# Altium footprint library PcbLib.PcbLib: 112 footprints (part 1 of 7)
Each footprint in its own frame and in the unit in brackets; x right, y up, seen from the top. Pads: shape width x height; smd on the part's side, far side on the other; paste and mask are expansions set on the pad; w line width, h text height; cw(c..) or ccw(c..) is an arc to the next point about the centre after c.
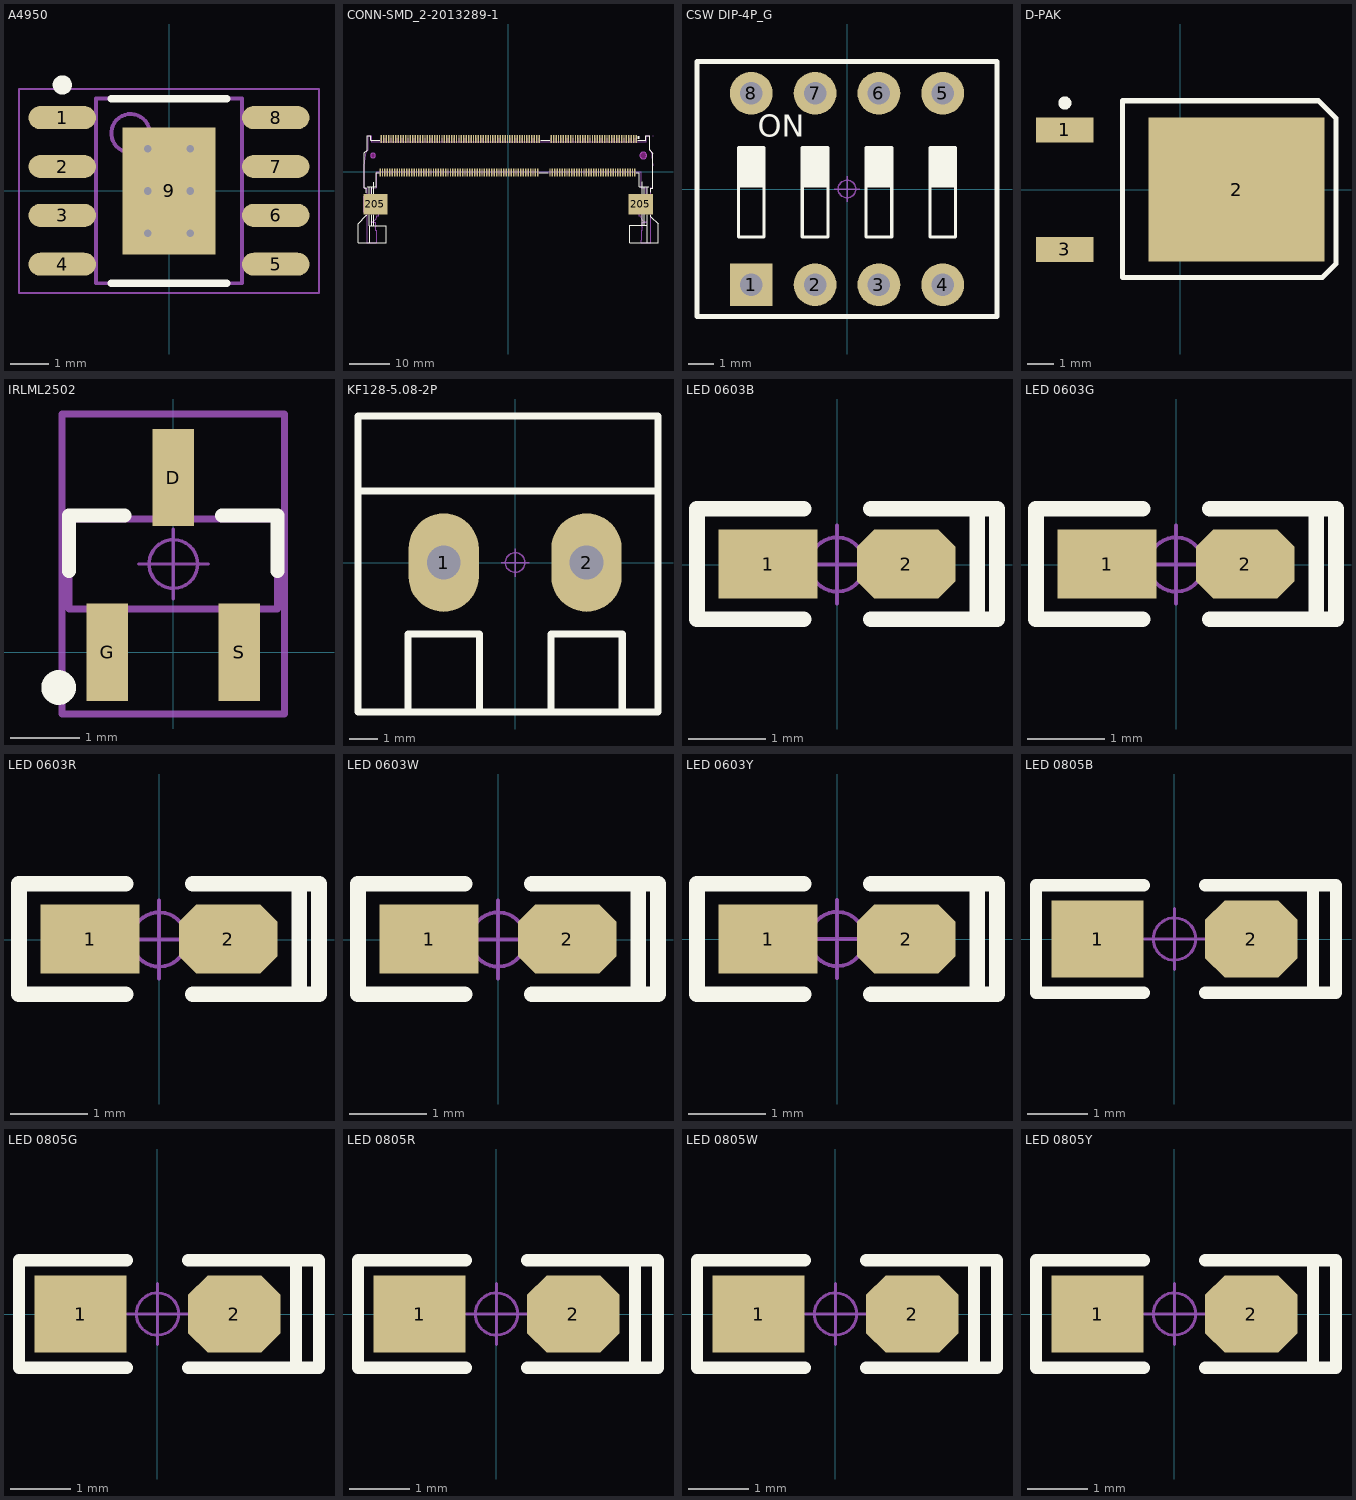
[diagram p0: the footprints below, top view; thin cyan lines are the x and y axes]

## A4950 [mm] "Package LJ, 8-Pin SOICN  with exposed thermal pad"
height 1.7
pads (9):
  oval 1.75x0.6 smd: 1(-2.775,1.905) 2(-2.775,0.635) 3(-2.775,-0.635) 4(-2.775,-1.905) 5(2.775,-1.905) 6(2.775,-0.635) 7(2.775,0.635) 8(2.775,1.905)
  rect 2.41x3.3 smd: 9(0,0)
via 0.55,-1.1 diameter 0.5 hole 0.2
via -0.55,-1.1 diameter 0.5 hole 0.2
via 0.55,0 diameter 0.5 hole 0.2
via -0.55,0 diameter 0.5 hole 0.2
via 0.55,1.1 diameter 0.5 hole 0.2
via -0.55,1.1 diameter 0.5 hole 0.2
Top Overlay:
  circle w0.25: c-2.775,2.755 r0.125
  lines w0.2: -1.5,-2.4 1.5,-2.4 ; -1.5,2.4 1.5,2.4
Mechanical 13:
  circle w0.1: c-1,1.5 r0.5
  lines w0.1: -1.9,-2.4 1.9,-2.4 1.9,2.4 -1.9,2.4 -1.9,-2.4
Mechanical 15:
  lines w0.05: -3.9,-2.65 3.9,-2.65 3.9,2.65 -3.9,2.65 -3.9,-2.65
  lines w0.1: -0.5,0 0.5,0 ; 0,-0.5 0,0.5
3D body "A4950.step": height 1.7, standoff 0, extent -3,-2.4 3,2.4

## CONN-SMD_2-2013289-1 [mil]
pads (206):
  rect 13.8x78.7 smd mask+2: 1(1246.1,316.9) 2(1234.3,-5.9) 3(1222.4,316.9) 4(1210.6,-5.9) 5(1198.8,316.9) 6(1187,-5.9) 7(1175.2,316.9) 8(1163.4,-5.9) 9(1151.6,316.9) 10(1139.8,-5.9) 11(1128,316.9) 12(1116.1,-5.9) 13(1104.3,316.9) 14(1092.5,-5.9) 15(1080.7,316.9) 16(1068.9,-5.9) 17(1057.1,316.9) 18(1045.3,-5.9) 19(1033.5,316.9) 20(1021.7,-5.9) 21(1009.8,316.9) 22(998,-5.9) 23(986.2,316.9) 24(974.4,-5.9) 25(962.6,316.9) 26(950.8,-5.9) 27(939,316.9) 28(927.2,-5.9) 29(915.4,316.9) 30(903.5,-5.9) 31(891.7,316.9) 32(879.9,-5.9) 33(868.1,316.9) 34(856.3,-5.9) 35(844.5,316.9) 36(832.7,-5.9) 37(820.9,316.9) 38(809.1,-5.9) 39(797.2,316.9) 40(785.4,-5.9) 41(773.6,316.9) 42(761.8,-5.9) 43(750,316.9) 44(738.2,-5.9) 45(726.4,316.9) 46(714.6,-5.9) 47(702.8,316.9) 48(690.9,-5.9) 49(679.1,316.9) 50(667.3,-5.9) 51(655.5,316.9) 52(643.7,-5.9) 53(631.9,316.9) 54(620.1,-5.9) 55(608.3,316.9) 56(596.5,-5.9) 57(584.6,316.9) 58(572.8,-5.9) 59(561,316.9) 60(549.2,-5.9) 61(537.4,316.9) 62(525.6,-5.9) 63(513.8,316.9) 64(502,-5.9) 65(490.2,316.9) 66(478.3,-5.9) 67(466.5,316.9) 68(454.7,-5.9) 69(442.9,316.9) 70(431.1,-5.9) 71(419.3,316.9) 72(407.5,-5.9) 73(301.2,316.9) 74(289.4,-5.9) 75(277.6,316.9) 76(265.7,-5.9) 77(253.9,316.9) 78(242.1,-5.9) 79(230.3,316.9) 80(218.5,-5.9) 81(206.7,316.9) 82(194.9,-5.9) 83(183.1,316.9) 84(171.3,-5.9) 85(159.4,316.9) 86(147.6,-5.9) 87(135.8,316.9) 88(124,-5.9) 89(112.2,316.9) 90(100.4,-5.9) 91(88.6,316.9) 92(76.8,-5.9) 93(65,316.9) 94(53.1,-5.9) 95(41.3,316.9) 96(29.5,-5.9) 97(17.7,316.9) 98(5.9,-5.9) 99(-5.9,316.9) 100(-17.7,-5.9) 101(-29.5,316.9) 102(-41.3,-5.9) 103(-53.2,316.9) 104(-65,-5.9) 105(-76.8,316.9) 106(-88.6,-5.9) 107(-100.4,316.9) 108(-112.2,-5.9) 109(-124,316.9) 110(-135.8,-5.9) 111(-147.6,316.9) 112(-159.4,-5.9) 113(-171.3,316.9) 114(-183.1,-5.9) 115(-194.9,316.9) 116(-206.7,-5.9) 117(-218.5,316.9) 118(-230.3,-5.9) 119(-242.1,316.9) 120(-253.9,-5.9) 121(-265.7,316.9) 122(-277.6,-5.9) 123(-289.4,316.9) 124(-301.2,-5.9) 125(-313,316.9) 126(-324.8,-5.9) 127(-336.6,316.9) 128(-348.4,-5.9) 129(-360.2,316.9) 130(-372,-5.9) 131(-383.9,316.9) 132(-395.7,-5.9) 133(-407.5,316.9) 134(-419.3,-5.9) 135(-431.1,316.9) 136(-442.9,-5.9) 137(-454.7,316.9) 138(-466.5,-5.9) 139(-478.3,316.9) 140(-490.2,-5.9) 141(-502,316.9) 142(-513.8,-5.9) 143(-525.6,316.9) 144(-537.4,-5.9) 145(-549.2,316.9) 146(-561,-5.9) 147(-572.8,316.9) 148(-584.6,-5.9) 149(-596.5,316.9) 150(-608.3,-5.9) 151(-620.1,316.9) 152(-631.9,-5.9) 153(-643.7,316.9) 154(-655.5,-5.9) 155(-667.3,316.9) 156(-679.1,-5.9) 157(-690.9,316.9) 158(-702.8,-5.9) 159(-714.6,316.9) 160(-726.4,-5.9) 161(-738.2,316.9) 162(-750,-5.9) 163(-761.8,316.9) 164(-773.6,-5.9) 165(-785.4,316.9) 166(-797.2,-5.9) 167(-809.1,316.9) 168(-820.9,-5.9) 169(-832.7,316.9) 170(-844.5,-5.9) 171(-856.3,316.9) 172(-868.1,-5.9) 173(-879.9,316.9) 174(-891.7,-5.9) 175(-903.5,316.9) 176(-915.4,-5.9) 177(-927.2,316.9) 178(-939,-5.9) 179(-950.8,316.9) 180(-962.6,-5.9) 181(-974.4,316.9) 182(-986.2,-5.9) 183(-998,316.9) 184(-1009.8,-5.9) 185(-1021.7,316.9) 186(-1033.5,-5.9) 187(-1045.3,316.9) 188(-1057.1,-5.9) 189(-1068.9,316.9) 190(-1080.7,-5.9) 191(-1092.5,316.9) 192(-1104.3,-5.9) 193(-1116.1,316.9) 194(-1128,-5.9) 195(-1139.8,316.9) 196(-1151.6,-5.9) 197(-1163.4,316.9) 198(-1175.2,-5.9) 199(-1187,316.9) 200(-1198.8,-5.9) 201(-1210.6,316.9) 202(-1222.4,-5.9) 203(-1234.3,316.9) 204(-1246.1,-5.9)
  rect 236.2x196.9 smd mask+2: 205(-1291.3,-316.9) 205(1291.3,-316.9)
Top Overlay:
  circle w10: c1269.7,332.7 r7.9
  lines w10: -1379.9,-206.7 -1379.9,-157.5 -1397.6,-157.5 -1397.6,183.1 -1370.1,210.6 -1370.1,350.4 -1338.6,350.4 -1338.6,305.1 -1299.2,305.1 -1250.2,305.1 ; -1377.9,-425.2 -1378.1,-425.2 -1460.8,-507.9 -1460.8,-692.9 -1187,-692.9 -1185.2,-691.1 -1185.2,-523.6 -1350.3,-523.6 ; -1370.1,-145.7 -1281.5,-145.7 -1281.5,-9.9 -1256.1,-9.9 ; -1350.3,-416.6 -1350.3,-523.6 ; -1350.3,-217.3 -1350.3,-145.7 ; -1348.7,-692.9 -1348.7,-525.2 -1350.3,-523.6 ; -1326.1,-523.6 -1326.1,-416.6 ; -1326.1,-217.3 -1326.1,-147.7 ; -1305.7,-523.6 -1305.7,-416.6 ; -1305.7,-217.3 -1305.7,-100.4 ; 305.4,-11.2 391.5,-11.2 ; 317.2,305.1 403.3,305.1 ; 1245.3,-11.2 1277.6,-11.2 1277.6,-145.7 1370.1,-145.7 ; 1261.1,305.1 1277.6,305.1 1338.6,305.1 1338.6,350.4 1370.1,350.4 1376,350.4 1376,212.6 1393.7,194.9 1409.4,179.1 1409.4,-157.5 1407.5,-159.4 1389.8,-159.4 1389.8,-198.8 ; 1303.6,-521.7 1303.6,-414.6 ; 1303.6,-215.3 1303.6,-98.4 ; 1324,-521.7 1324,-414.6 ; 1324,-215.3 1324,-145.7 ; 1352.2,-416.6 1352.2,-521.7 ; 1352.2,-217.3 1352.2,-145.7 ; 1353.3,-692.9 1353.3,-522.7 1352.2,-521.7 ; 1389.8,-423.2 1389.8,-437 1458.7,-505.9 1458.7,-690.9 1456.7,-692.9 1183.1,-692.9 1183.1,-521.7 1352.2,-521.7
Keep-Out Layer:
  board cut-out: -1291.4,157.5 -1291.4,162.19 -1294.99,170.87 -1301.63,177.51 -1310.31,181.1 -1319.69,181.1 -1328.37,177.51 -1335.01,170.87 -1338.6,162.19 -1338.6,157.5 -1338.6,152.81 -1335.01,144.13 -1328.37,137.49 -1319.69,133.9 -1310.31,133.9 -1301.63,137.49 -1294.99,144.13 -1291.4,152.81
  board cut-out: 1348.5,157.5 1348.5,161.91 1346.22,170.43 1341.81,178.07 1335.57,184.31 1327.93,188.72 1319.41,191 1310.59,191 1302.07,188.72 1294.43,184.31 1288.19,178.07 1283.78,170.43 1281.5,161.91 1281.5,157.5 1281.5,153.09 1283.78,144.57 1288.19,136.93 1294.43,130.69 1302.07,126.28 1310.59,124 1319.41,124 1327.93,126.28 1335.57,130.69 1341.81,136.93 1346.22,144.57 1348.5,153.09
Mechanical 1:
  circle w0.2: c-1315,157.5 r23.6
  circle w0.2: c1315,157.5 r33.5
Mechanical 15:
  drawing of 327 lines, arcs and shapes, not listed

## CSW DIP-4P_G [mm] "11.7*9.9*7mm"
pads (8):
  rect 1.7x1.7 hole 0.9: 1(-3.81,-3.81)
  round 1.7 hole 0.9: 2(-1.27,-3.81) 3(1.27,-3.81) 4(3.81,-3.81) 5(3.81,3.81) 6(1.27,3.81) 7(-1.27,3.81) 8(-3.81,3.81)
Top Overlay:
  rectangle: 3.302,0.127 4.318,1.651
  rectangle: 0.762,0.127 1.778,1.651
  rectangle: -1.778,0.127 -0.762,1.651
  rectangle: -4.318,0.127 -3.302,1.651
  lines w0.127: -4.318,0.127 -3.302,0.127 ; -1.778,0.127 -0.762,0.127 ; 0.762,0.127 1.778,0.127 ; 3.302,0.127 4.318,0.127 ; -4.318,-1.905 -3.302,-1.905 -3.302,1.651 -4.318,1.651 -4.318,-1.905 ; -1.778,-1.905 -0.762,-1.905 -0.762,1.651 -1.778,1.651 -1.778,-1.905 ; 0.762,-1.905 1.778,-1.905 1.778,1.651 0.762,1.651 0.762,-1.905 ; 3.302,-1.905 4.318,-1.905 4.318,1.651 3.302,1.651 3.302,-1.905
  lines w0.2: -5.969,-5.08 5.969,-5.08 5.969,5.08 -5.969,5.08 -5.969,-5.08
  text "ON" at -3.556,1.778 h1.52
Mechanical 15:
  circle w0.05: c0,0 r0.35
  lines w0.05: -0.5,0 0.5,0 ; 0,-0.5 0,0.5
3D body "CSW DIP-4P_G.STEP": height 6.65, standoff -3.15, extent -5.86,-4.95 5.86,4.95

## D-PAK [mm] "D-PAK  / SOT-428 / TO252 - 3"
height 2.38
pads (3):
  rect 2.2x0.95 smd: 1(-4.4,2.28) 3(-4.4,-2.28)
  rect 6.7x5.5 smd: 2(2.15,0)
Top Overlay:
  circle w0.25: c-4.4,3.305 r0.125
  lines w0.1: -2.2,-3.35 -2.2,3.35
  lines w0.2: -2.2,-3.35 5.418,-3.35 5.944,-2.824 5.944,2.725 5.278,3.391 -2.2,3.391 -2.2,-3.35
3D body "D-PAK.STEP": height 2.31, standoff 0, extent -4.475,-3.3 4.775,3.3

## IRLML2502 [mm] "3x1.3x1mm(�����)"
height 1.1
pads (3):
  rect 0.6x1.4 smd: D(0,2.514) G(-0.95,0) S(0.95,0)
Top Overlay:
  circle w0.25: c-1.651,-0.508 r0.125
  lines w0.2: -1.5,1.17 -1.5,1.97 -0.7,1.97 ; 0.7,1.97 1.5,1.97 1.5,1.17
Mechanical 13:
  lines w0.1: -1.5,0.62 -1.5,1.92 1.5,1.92 1.5,0.62 -1.5,0.62
Mechanical 15:
  circle w0.05: c0,1.27 r0.35
  lines w0.05: -0.5,1.27 0.5,1.27 ; 0,0.77 0,1.77
  lines w0.1: -1.6,-0.889 -1.6,3.429 1.6,3.429 1.6,-0.889 -1.6,-0.889
3D body "SOT23-3.STEP": height 1.05, standoff 0, extent -1.5,0.07 1.5,2.47

## KF128-5.08-2P [mm] "�ݶ�ʽ���߶��ӣ��ž�5.08mm"
pads (2):
  oval 2.5x3.5 hole 1.2: 1(-2.54,0) 2(2.54,0)
Top Overlay:
  lines w0.254: -5.588,2.54 5.08,2.54 ; -3.81,-5.309 -3.81,-2.54 -1.27,-2.54 -1.27,-5.309 ; 1.27,-5.309 1.27,-2.54 3.81,-2.54 3.81,-5.309 ; -5.588,-5.309 -5.588,5.207 5.08,5.207 5.08,-5.309 -5.588,-5.309
Mechanical 15:
  circle w0.05: c0,0 r0.35
  lines w0.05: -0.5,0 0.5,0 ; 0,-0.5 0,0.5
3D body "KF128-5.08.STEP": height 14.15, standoff -3.95, extent -5.58,-5.3 0,5.2
3D body "KF128-5.08.STEP": height 14.15, standoff -3.95, extent -0.5,-5.3 5.08,5.2

## LED 0603B [mil] "��ɫ0603LED                             �Ա�ID:�ƾ���ʯ"
pads (2):
  rect 50x35 smd: 1(-35,0.26)
  oct 50x35 smd: 2(35,0.26)
Top Overlay:
  lines w8: -17,-27.74 -71,-27.74 -71,-25.74 -71,28.26 -70,28.26 -17,28.26 ; 17,-27.74 70,-27.74 ; 17,28.26 71,28.26 81,28.26 81,-27.74 71,-27.74 71,26.26
Mechanical 15:
  circle w1.97: c0,0 r13.78
  lines w1.97: -19.68,0 19.68,0 ; 0,-19.68 0,19.68
3D body "LED 0603-B.STEP": height 18.36, standoff -0.16, extent -31.49,-15.79 31.5,15.79
3D body "LED 0603������.STEP": height 23.82, standoff 8.07, extent -23.58,-15.79 23.58,15.79

## LED 0603G [mil] "��ɫ0603LED                                   �Ա�ID:�ƾ���ʯ"
pads (2):
  rect 50x35 smd: 1(-35,0.26)
  oct 50x35 smd: 2(35,0.26)
Top Overlay:
  lines w8: -17,-27.74 -71,-27.74 -71,-25.74 -71,28.26 -70,28.26 -17,28.26 ; 17,-27.74 70,-27.74 ; 17,28.26 71,28.26 81,28.26 81,-27.74 71,-27.74 71,26.26
Mechanical 15:
  circle w1.97: c0,0 r13.78
  lines w1.97: -19.68,0 19.68,0 ; 0,-19.68 0,19.68
3D body "LED 0603-G.STEP": height 18.36, standoff -0.16, extent -31.49,-15.79 31.5,15.79
3D body "LED 0603������.": height 0, standoff 0, extent 0,0 0,0

## LED 0603R [mil] "��ɫ0603LED                                           �Ա�ID:�ƾ���ʯ"
pads (2):
  rect 50x35 smd: 1(-35,0.26)
  oct 50x35 smd: 2(35,0.26)
Top Overlay:
  lines w8: -17,-27.74 -71,-27.74 -71,-25.74 -71,28.26 -70,28.26 -17,28.26 ; 17,-27.74 70,-27.74 ; 17,28.26 71,28.26 81,28.26 81,-27.74 71,-27.74 71,26.26
Mechanical 15:
  circle w1.97: c0,0 r13.78
  lines w1.97: -19.68,0 19.68,0 ; 0,-19.68 0,19.68
3D body "LED 0603-R.STEP": height 18.36, standoff -0.16, extent -31.5,-15.79 31.5,15.79
3D body "LED 0603������.": height 0, standoff 0, extent 0,0 0,0

## LED 0603W [mil] "��ɫ0603LED                                        �Ա�ID:�ƾ���ʯ"
pads (2):
  rect 50x35 smd: 1(-35,0.26)
  oct 50x35 smd: 2(35,0.26)
Top Overlay:
  lines w8: -17,-27.74 -71,-27.74 -71,-25.74 -71,28.26 -70,28.26 -17,28.26 ; 17,-27.74 70,-27.74 ; 17,28.26 71,28.26 81,28.26 81,-27.74 71,-27.74 71,26.26
Mechanical 15:
  circle w1.97: c0,0 r13.78
  lines w1.97: -19.68,0 19.68,0 ; 0,-19.68 0,19.68
3D body "LED 0603������.": height 0, standoff 0, extent 0,0 0,0
3D body "LED 0603-W.STEP": height 18.36, standoff -0.16, extent -31.49,-15.79 31.5,15.79

## LED 0603Y [mil] "��ɫ0603LED                              �Ա�ID:�ƾ���ʯ"
pads (2):
  rect 50x35 smd: 1(-35,0)
  oct 50x35 smd: 2(35,0)
Top Overlay:
  lines w8: -17,-28 -71,-28 -71,-26 -71,28 -70,28 -17,28 ; 17,-28 70,-28 ; 17,28 71,28 81,28 81,-28 71,-28 71,26
Mechanical 15:
  circle w1.97: c0,0 r13.78
  lines w1.97: -19.68,0 19.68,0 ; 0,-19.68 0,19.68
3D body "LED 0603-Y.STEP": height 18.36, standoff -0.16, extent -31.5,-16.04 31.49,15.53
3D body "LED 0603������.": height 0, standoff 0, extent 0,0 0,0

## LED 0805B [mil] "��ɫ0805LED                                    �Ա�ID:�ƾ���ʯ"
pads (2):
  rect 60x50 smd: 1(-50,0)
  oct 60x50 smd: 2(50,0)
Top Overlay:
  lines w8: -20,-35 -90,-35 -90,35 -20,35 ; 20,-35 105,-35 105,35 20,35 ; 90,-35 90,35
Mechanical 15:
  circle w1.97: c0,0 r13.78
  lines w1.97: -19.68,0 19.68,0 ; 0,-19.68 0,19.68
3D body "LED 0805������.STEP": height 31.69, standoff 12.01, extent -29.49,-24.65 29.49,24.65
3D body "LED 0805-B.STEP": height 26.33, standoff -0.16, extent -39.37,-24.65 39.37,24.65

## LED 0805G [mil] "��ɫ0805LED                              �Ա�ID:�ƾ���ʯ"
pads (2):
  rect 60x50 smd: 1(-50,0)
  oct 60x50 smd: 2(50,0)
Top Overlay:
  lines w8: -20,-35 -90,-35 -90,35 -20,35 ; 20,-35 105,-35 105,35 20,35 ; 90,-35 90,35
Mechanical 15:
  circle w1.97: c0,0 r13.78
  lines w1.97: -19.68,0 19.68,0 ; 0,-19.68 0,19.68
3D body "LED 0805-G.STEP": height 26.33, standoff -0.16, extent -39.37,-24.65 39.37,24.65
3D body "LED 0805������.ST": height 31.69, standoff 12.01, extent -29.49,-24.65 29.49,24.65

## LED 0805R [mil] "��ɫ0805LED                                       �Ա�ID:�ƾ���ʯ"
pads (2):
  rect 60x50 smd: 1(-50,0)
  oct 60x50 smd: 2(50,0)
Top Overlay:
  lines w8: -20,-35 -90,-35 -90,35 -20,35 ; 20,-35 105,-35 105,35 20,35 ; 90,-35 90,35
Mechanical 15:
  circle w1.97: c0,0 r13.78
  lines w1.97: -19.68,0 19.68,0 ; 0,-19.68 0,19.68
3D body "LED 0805������.ST": height 31.69, standoff 12.01, extent -29.49,-24.65 29.49,24.65
3D body "LED 0805-R.STEP": height 26.33, standoff -0.16, extent -39.37,-24.65 39.37,24.64

## LED 0805W [mil] "��ɫ0805LED"
pads (2):
  rect 60x50 smd: 1(-50,0)
  oct 60x50 smd: 2(50,0)
Top Overlay:
  lines w8: -20,-35 -90,-35 -90,35 -20,35 ; 20,-35 105,-35 105,35 20,35 ; 90,-35 90,35
Mechanical 15:
  circle w1.97: c0,0 r13.78
  lines w1.97: -19.68,0 19.68,0 ; 0,-19.68 0,19.68
3D body "LED 0805������.ST": height 31.69, standoff 12.01, extent -29.49,-24.65 29.49,24.65
3D body "LED 0805-W.STEP": height 26.33, standoff -0.16, extent -39.37,-24.65 39.37,24.64

## LED 0805Y [mil] "��ɫ0805LED      �Ա�ID:�ƾ���ʯ"
pads (2):
  rect 60x50 smd: 1(-50,0)
  oct 60x50 smd: 2(50,0)
Top Overlay:
  lines w8: -20,-35 -90,-35 -90,35 -20,35 ; 20,-35 105,-35 105,35 20,35 ; 90,-35 90,35
Mechanical 15:
  circle w1.97: c0,0 r13.78
  lines w1.97: -19.68,0 19.68,0 ; 0,-19.68 0,19.68
3D body "LED 0805������.ST": height 31.69, standoff 12.01, extent -29.49,-24.65 29.49,24.65
3D body "LED 0805-Y.STEP": height 26.33, standoff -0.16, extent -39.37,-24.65 39.37,24.65